# Altium footprint library USB Connectors.PcbLib: 41 footprints (part 3 of 3)
Each footprint in its own frame and in the unit in brackets; x right, y up, seen from the top. Pads: shape width x height; smd on the part's side, far side on the other; paste and mask are expansions set on the pad; w line width, h text height; cw(c..) or ccw(c..) is an arc to the next point about the centre after c.
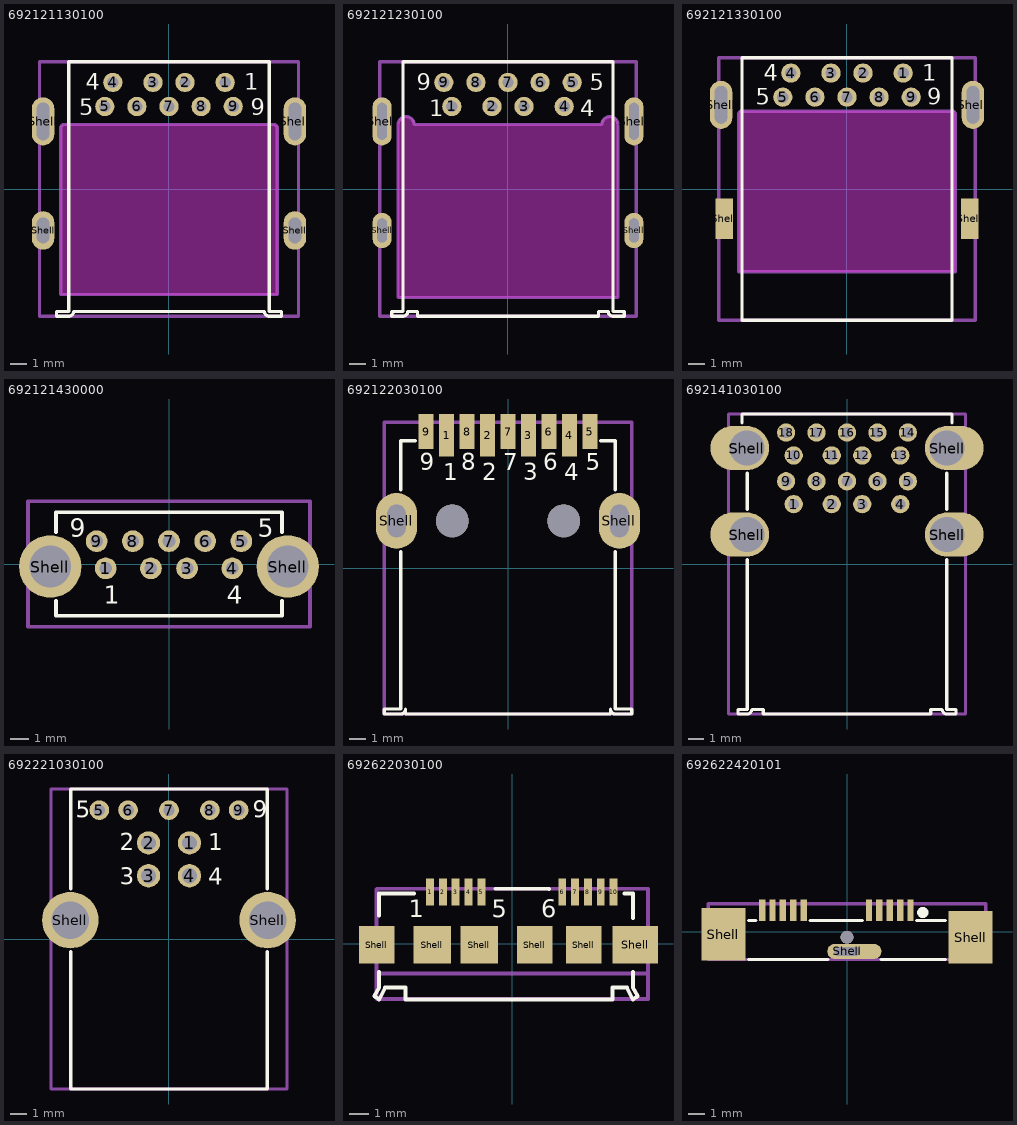
[diagram p2: the footprints below, top view; thin cyan lines are the x and y axes]

## 692121130100 [mm] "USB 3.0 Type A Reverse Horizontal w. Offset 0.14mm"
height 5.12
pads (13):
  round 1.2 hole 0.7: 1(3.5,6.645) 2(1,6.645) 3(-1,6.645) 4(-3.5,6.645) 5(-4,5.145) 6(-2,5.145) 7(0,5.145) 8(2,5.145) 9(4,5.145)
  oval 1.4x2.4 hole 0.8 slot 1.6 at 90 deg: Shell(-7.85,-2.585) Shell(7.85,-2.585)
  oval 1.4x3 hole 0.8 slot 2.35 at 90 deg: Shell(-7.85,4.215) Shell(7.85,4.215)
Top Overlay:
  lines w0.2: -7.01,-7.935 -6.26,-7.935 ccw(c-6.25,-7.635) -5.95,-7.635 5.95,-7.635 ccw(c6.25,-7.635) 6.26,-7.935 7.01,-7.935 7.01,-7.635 6.25,-7.635 6.25,7.935 -6.25,7.935 -6.25,-7.635 -7.01,-7.635 -7.01,-7.935
  text "1" at 4.7,6.2 h1.02
  text "9" at 5.1,4.6 h1.02
  text "4" at -5.2,6.2 h1.02
  text "5" at -5.6,4.6 h1.02
Keep-Out Layer:
  board cut-out: -6.75,-6.585 6.75,-6.585 6.75,3.815 6.75,3.855 6.72,3.928 6.663,3.985 6.59,4.015 6.55,4.015 -6.55,4.015 -6.59,4.015 -6.663,3.985 -6.72,3.928 -6.75,3.855 -6.75,3.815
Mechanical 13:
  lines w0.2: -8.078,-7.935 8.078,-7.935 8.078,7.935 -8.078,7.935 -8.078,-7.935
Mechanical 15:
  lines w0.2: -6.75,-6.585 6.75,-6.585 6.75,3.815 ccw(c6.55,3.815) 6.55,4.015 -6.55,4.015 ccw(c-6.55,3.815) -6.75,3.815 -6.75,-6.585
  text "PCB Cutout Area" at -5,-1.57 h1.5
3D body "692121130100.stp": height 4.05, standoff -3.67, extent -8.078,-7.935 8.078,7.935

## 692121230100 [mm] "USB 3.0 Type A Horizontal with Offset 1.04mm"
height 3.9
pads (13):
  round 1.2 hole 0.7: 1(-3.5,5.145) 2(-1,5.145) 3(1,5.145) 4(3.5,5.145) 5(4,6.645) 6(2,6.645) 7(0,6.645) 8(-2,6.645) 9(-4,6.645)
  oval 1.2x2.2 hole 0.6 slot 1.5 at 90 deg: Shell(-7.85,-2.585) Shell(7.85,-2.585)
  oval 1.2x3 hole 0.6 slot 2.3 at 90 deg: Shell(-7.85,4.215) Shell(7.85,4.215)
Top Overlay:
  lines w0.2: -7.25,-7.935 -7.25,-7.635 -6.55,-7.635 -6.55,7.935 6.55,7.935 6.55,-7.635 7.25,-7.635 7.25,-7.935 6.56,-7.935 cw(c6.55,-7.635) 6.25,-7.635 5.65,-7.635 5.65,-7.935 -5.65,-7.935 -5.65,-7.635 -6.25,-7.635 cw(c-6.55,-7.635) -6.56,-7.935 -7.25,-7.935
  text "1" at -4.9,4.545 h1.02
  text "9" at -5.7,6.145 h1.02
  text "4" at 4.5,4.545 h1.02
  text "5" at 5.1,6.145 h1.02
Keep-Out Layer:
  board cut-out: -6.85,-6.755 6.85,-6.755 6.85,4.015 6.85,4.115 6.774,4.298 6.633,4.439 6.449,4.515 6.251,4.515 6.067,4.439 5.926,4.298 5.85,4.115 5.85,4.015 -5.85,4.015 -5.85,4.115 -5.926,4.298 -6.067,4.439 -6.251,4.515 -6.449,4.515 -6.633,4.439 -6.774,4.298 -6.85,4.115 -6.85,4.015
Mechanical 13:
  lines w0.2: -8,-7.935 8,-7.935 8,7.935 -8,7.935 -8,-7.935
Mechanical 15:
  lines w0.2: -6.85,-6.755 -6.85,4.015 cw(c-6.35,4.015) -5.85,4.015 5.85,4.015 cw(c6.35,4.015) 6.85,4.015 6.85,-6.755 -6.85,-6.755
  text "PCB Cutout Area" at -4.7,-1.425 h1.5
3D body "692121230100.stp": height 4.6, standoff -2.52, extent -8,-7.935 8,7.935

## 692121330100 [mm] "USB 3.0 Type A Reverse Horizontal with Offset 1.75mm"
height 7.4
pads (13):
  round 1.2 hole 0.7: 1(3.5,7.225) 2(1,7.225) 3(-1,7.225) 4(-3.5,7.225) 5(-4,5.725) 6(-2,5.725) 7(0,5.725) 8(2,5.725) 9(4,5.725)
  oval 1.4x3 hole 0.8 slot 2.35 at 90 deg: Shell(-7.85,5.245) Shell(7.85,5.245)
  rect 1.1x2.5 smd: Shell(-7.65,-1.855) Shell(7.65,-1.855)
Top Overlay:
  lines w0.2: -6.55,-8.185 -6.55,8.185 6.55,8.185 6.55,-8.185 -6.55,-8.185
  text "1" at 4.7,6.745 h1.02
  text "9" at 5,5.245 h1.02
  text "4" at -5.2,6.745 h1.02
  text "5" at -5.7,5.245 h1.02
Keep-Out Layer:
  board cut-out: -6.75,-5.155 -6.75,4.675 -6.75,4.709 -6.724,4.771 -6.676,4.819 -6.614,4.845 -6.58,4.845 6.58,4.845 6.614,4.845 6.676,4.819 6.724,4.771 6.75,4.709 6.75,4.675 6.75,-5.155
Mechanical 13:
  lines w0.2: -8,-8.185 -8,8.185 8,8.185 8,-8.185 -8,-8.185
Mechanical 15:
  lines w0.2: -6.75,-5.155 6.75,-5.155 6.75,4.675 ccw(c6.58,4.675) 6.58,4.845 -6.58,4.845 ccw(c-6.58,4.675) -6.75,4.675 -6.75,-5.155
  text "PCB Cutout Area" at -4.75,-0.15 h1.5
3D body "692121330100.stp": height 2.99, standoff -4.41, extent -8,-8.185 8,8.185

## 692121430000 [mm] "USB 3.0 Type A Vertical THT"
height 15
pads (11):
  round 1.2 hole 0.7: 1(-3.5,-0.235) 2(-1,-0.235) 3(1,-0.235) 4(3.5,-0.235) 5(4,1.265) 6(2,1.265) 7(0,1.265) 8(-2,1.265) 9(-4,1.265)
  round 3.45 hole 2.3: Shell(-6.57,-0.135) Shell(6.57,-0.135)
Top Overlay:
  lines w0.2: -6.25,-2.035 -6.25,-2.855 6.25,-2.855 6.25,-2.035 ; -6.25,1.765 -6.25,2.865 6.25,2.865 6.25,1.765
  text "5" at 4.9,1.515 h1.02
  text "4" at 3.2,-2.185 h1.02
  text "9" at -5.5,1.515 h1.02
  text "1" at -3.6,-2.185 h1.02
Mechanical 13:
  lines w0.2: -7.8,-3.475 -7.8,3.485 7.8,3.485 7.8,-3.475 -7.8,-3.475
3D body "692121430000.stp": height 15.1, standoff -3.67, extent -7.8,-3.475 7.8,3.475

## 692122030100 [mm] "USB 3.0 Type A Horizontal SMD"
height 6.99
pads (13):
  rect 0.9x2.6 smd: 1(-3.75,8.105) 2(-1.25,8.105) 3(1.25,8.105) 4(3.75,8.105)
  rect 0.9x2.15 smd: 5(5,8.33) 6(2.5,8.33) 7(0,8.33) 8(-2.5,8.33) 9(-5,8.33)
  oval 2.52x3.4 hole 1.12 slot 2 at 90 deg: Shell(-6.8,2.885) Shell(6.8,2.885)
  round 2 hole 2 unplated: ""(-3.4,2.885) ""(3.4,2.885)
Top Overlay:
  lines w0.2: -6.55,1.005 -6.55,-8.595 -7.55,-8.595 -7.55,-8.895 -6.56,-8.895 ccw(c-6.55,-8.595) -6.25,-8.595 -6.25,-8.895 6.25,-8.895 6.25,-8.595 ccw(c6.55,-8.595) 6.56,-8.895 7.55,-8.895 7.55,-8.595 6.55,-8.595 6.55,1.005 ; -6.55,4.765 -6.55,7.765 -5.65,7.765 ; 5.65,7.765 6.55,7.765 6.55,4.765
  text "9" at -5.38,5.965 h1.02
  text "1" at -3.94,5.365 h1.02
  text "8" at -2.84,5.965 h1.02
  text "2" at -1.56,5.365 h1.02
  text "7" at -0.29,5.965 h1.02
  text "3" at 0.93,5.365 h1.02
  text "6" at 2.15,5.965 h1.02
  text "4" at 3.43,5.365 h1.02
  text "5" at 4.74,5.965 h1.02
Mechanical 13:
  lines w0.2: -7.55,-8.895 7.55,-8.895 7.55,8.905 -7.55,8.905 -7.55,-8.895
3D body "692122030100.stp": height 7.96, standoff -2.28, extent -7.55,-8.895 7.55,8.905

## 692141030100 [mm] "USB 3.0 Type A Stacked"
height 15.42
pads (22):
  round 1.2 hole 0.7: 1(-3.5,3.93) 2(-1,3.93) 3(1,3.93) 4(3.5,3.93) 5(4,5.43) 6(2,5.43) 7(0,5.43) 8(-2,5.43) 9(-4,5.43) 10(-3.5,7.13) 11(-1,7.13) 12(1,7.13) 13(3.5,7.13) 14(4,8.63) 15(2,8.63) 16(0,8.63) 17(-2,8.63) 18(-4,8.63)
  oval 3.85x2.9 hole 2.3 copper offset -0.475,0: Shell(-6.57,1.93) Shell(-6.57,7.61)
  oval 3.85x2.9 hole 2.3 copper offset 0.475,0: Shell(6.57,1.93) Shell(6.57,7.61)
Top Overlay:
  lines w0.2: -6.9,9.26 -6.9,9.85 6.9,9.85 6.9,9.26 ; -6.55,0.28 -6.55,-9.55 -7.15,-9.55 -7.15,-9.85 -6.56,-9.85 ccw(c-6.55,-9.55) -6.25,-9.55 -5.5,-9.55 -5.5,-9.85 5.5,-9.85 5.5,-9.55 6.25,-9.55 ccw(c6.55,-9.55) 6.56,-9.85 7.15,-9.85 7.15,-9.55 6.55,-9.55 6.55,0.28 ; -6.55,3.58 -6.55,5.97 ; 6.55,3.58 6.55,5.97
Mechanical 13:
  lines w0.2: -7.795,-9.85 -7.795,9.85 7.795,9.85 7.795,-9.85 -7.795,-9.85
3D body "692141030100.stp": height 16.11, standoff -3.5, extent -7.794,-9.85 7.794,9.85

## 692221030100 [mm] "USB 3.0 Type B Horizontal"
height 12.9
pads (11):
  round 1.42 hole 0.92: 1(1.25,5.86) 2(-1.25,5.86) 3(-1.25,3.86) 4(1.25,3.86)
  round 1.2 hole 0.7: 5(-4.25,7.86) 6(-2.5,7.86) 7(0,7.86) 8(2.5,7.86) 9(4.25,7.86)
  round 3.45 hole 2.3: Shell(-6.02,1.15) Shell(6.02,1.15)
Top Overlay:
  lines w0.2: -6,-0.78 -6,-9.15 6,-9.15 6,-0.78 ; -6,3.07 -6,9.15 6,9.15 6,3.07
  text "9" at 5.1,7.405 h1.02
  text "5" at -5.7,7.405 h1.02
  text "4" at 2.4,3.305 h1.02
  text "3" at -3,3.305 h1.02
  text "2" at -3,5.405 h1.02
  text "1" at 2.4,5.405 h1.02
Mechanical 13:
  lines w0.2: -7.2,-9.15 -7.2,9.15 7.2,9.15 7.2,-9.15 -7.2,-9.15
3D body "692221030100.stp": height 12.95, standoff -3.18, extent -7.2,-9.15 7.2,9.15

## 692622030100 [mm] "Micro USB 3.0 Type B Horizontal SMT"
height 2.58
pads (16):
  rect 0.4x1.35 smd: 1(-4.17,2.63) 2(-3.52,2.63) 3(-2.87,2.63) 4(-2.22,2.63) 5(-1.57,2.63) 6(2.53,2.63) 7(3.18,2.63) 8(3.83,2.63) 9(4.48,2.63) 10(5.13,2.63)
  rect 1.8x1.9 smd: Shell(-6.87,-0.045) Shell(1.13,-0.045) Shell(3.63,-0.045)
  rect 1.9x1.9 smd: Shell(-4.07,-0.045) Shell(-1.67,-0.045)
  rect 2.3x1.9 smd: Shell(6.23,-0.045)
Top Overlay:
  lines w0.2: -6.745,-1.422 -6.745,-2.205 -6.995,-2.645 -6.745,-2.805 -6.445,-2.205 -5.405,-2.205 -5.405,-2.805 5.065,-2.805 5.065,-2.205 5.805,-2.205 6.105,-2.805 6.355,-2.645 6.105,-2.205 6.105,-1.422 ; -6.745,1.448 -6.745,2.545 -4.978,2.545 ; -0.864,2.795 1.854,2.794 ; 5.69,2.545 6.105,2.545 6.105,1.321
  text "6" at 1.455,1.345 h0.89
  text "1" at -5.245,1.345 h0.89
  text "5" at -1.045,1.345 h0.89
Mechanical 13:
  lines w0.2: -6.87,-2.795 6.88,-2.795 6.88,2.795 -6.87,2.795 -6.87,-2.795
Mechanical 15:
  lines w0.2: -6.87,-1.495 6.88,-1.495
  text "PCB Edge" at -1.82,-2.308 h0.89
Mechanical 29:
  lines w0.15: -6.909,-2.769 -6.909,2.794 6.909,2.794 6.909,-2.794 -6.883,-2.794
  text ".Designator" at -2.946,-0.356 h1.52
3D body "692622030100.stp": height 2.84, standoff -0.11, extent -6.87,-2.795 6.872,2.807

## 692622420101 [mm] "Micro USB 3.0 Type B Vertical SMT"
height 5.15
pads (14):
  rect 0.4x1.35 smd: 1(3.98,1.34) 2(3.33,1.34) 3(2.68,1.34) 4(2.03,1.34) 5(1.38,1.34) 6(-2.72,1.34) 7(-3.37,1.34) 8(-4.02,1.34) 9(-4.67,1.34) 10(-5.32,1.34)
  rect 2.75x3.3 smd: Shell(-7.75,-0.16) Shell(7.75,-0.35)
  oval 3.4x0.95 hole 0.55 slot 1.6 at 0 deg copper offset 0.46,0: Shell(0,-1.24)
  round 0.8 hole 0.8 unplated: ""(0,-0.35)
Top Overlay:
  circle w0.5: c4.75,1.2 r0.1
  lines w0.2: -6.18,-1.75 -1.21,-1.75 ; -6.17,0.7 -5.72,0.7 ; -2.32,0.7 0.98,0.7 ; 2.13,-1.75 6.17,-1.75 ; 4.37,0.7 6.17,0.7
Mechanical 13:
  lines w0.2: -8.7,-1.75 8.7,-1.75 8.7,1.75 -8.7,1.75 -8.7,-1.75
3D body "692622420101.stp": height 5.82, standoff -0.83, extent -8.7,-1.75 8.7,1.75